# Altium footprint library connectors_micromatch.PcbLib: 36 footprints (part 2 of 3)
Each footprint in its own frame and in the unit in brackets; x right, y up, seen from the top. Pads: shape width x height; smd on the part's side, far side on the other; paste and mask are expansions set on the pad; w line width, h text height; cw(c..) or ccw(c..) is an arc to the next point about the centre after c.
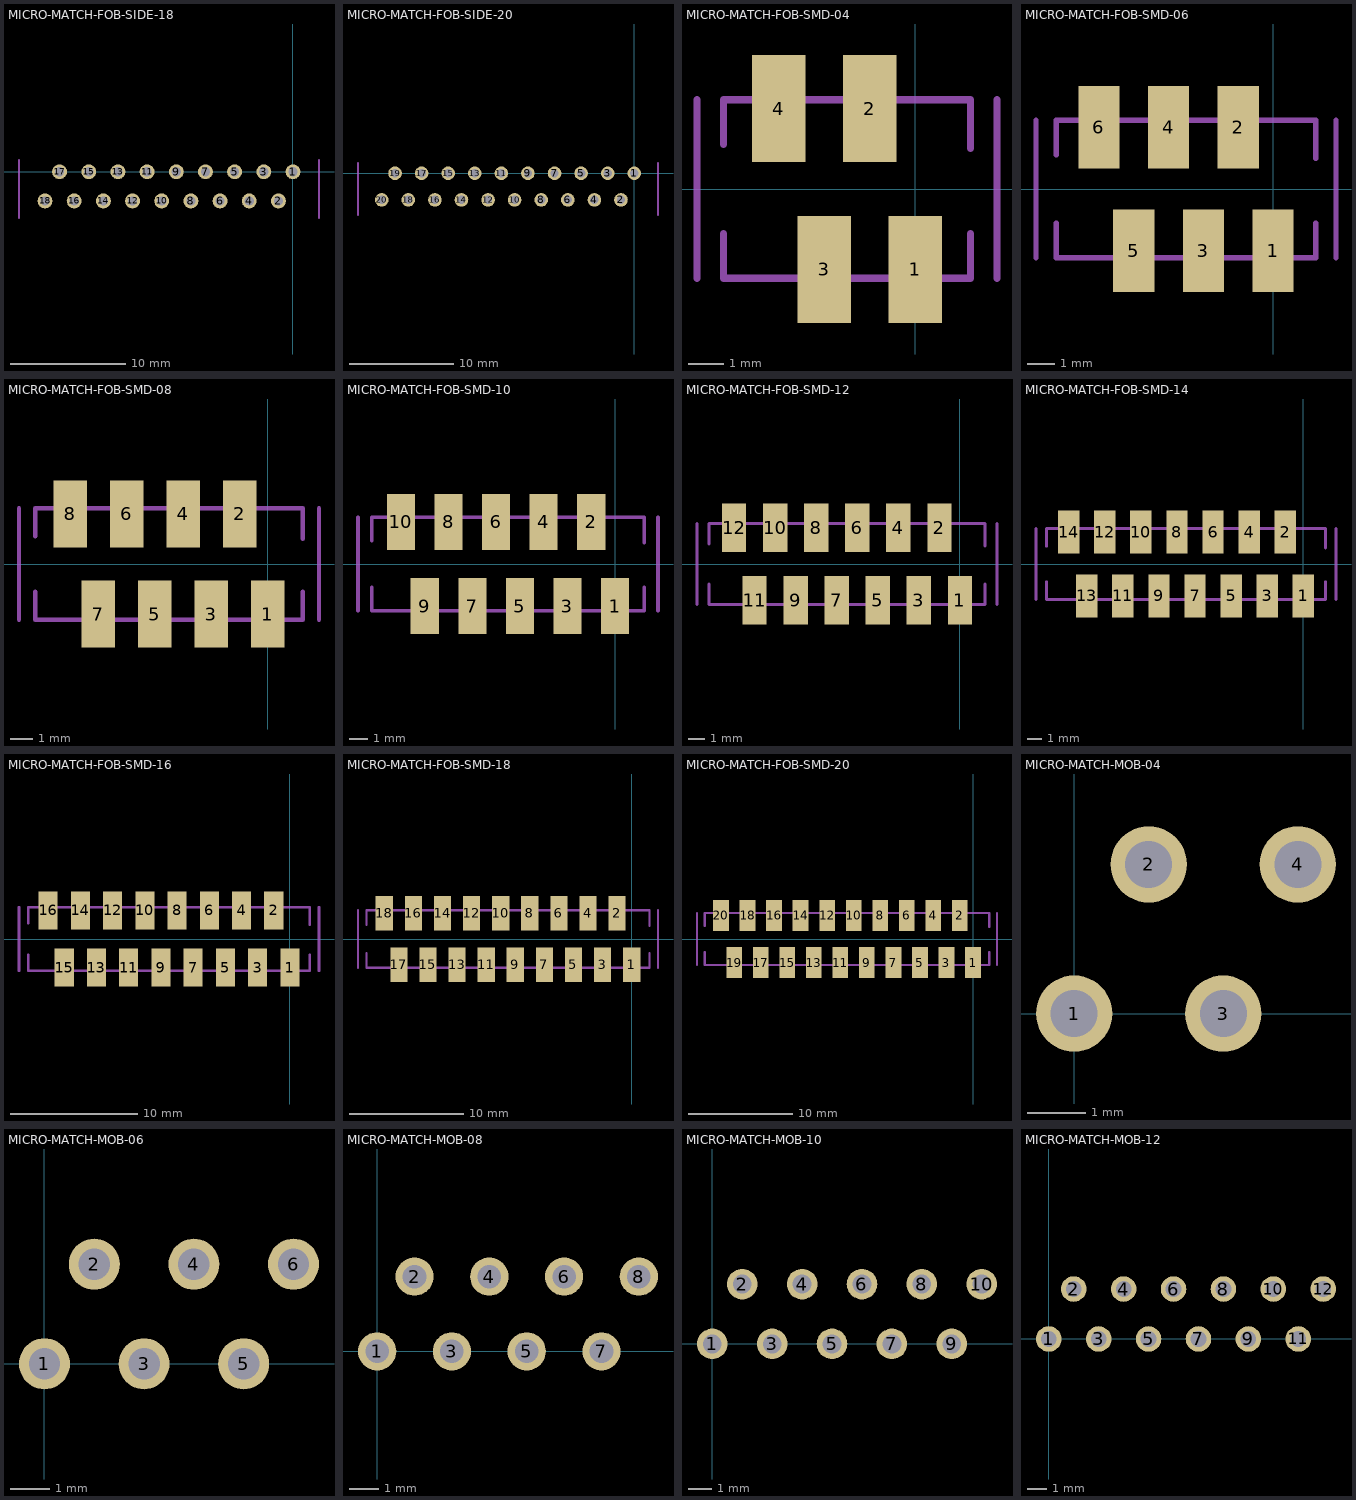
[diagram p1: the footprints below, top view; thin cyan lines are the x and y axes]

## MICRO-MATCH-FOB-SIDE-18 [mm]
height 4
pads (18):
  round 1.3 hole 0.8: 1(0,0) 2(-1.27,-2.54) 3(-2.54,0) 4(-3.81,-2.54) 5(-5.08,0) 6(-6.35,-2.54) 7(-7.62,0) 8(-8.89,-2.54) 9(-10.16,0) 10(-11.43,-2.54) 11(-12.7,0) 12(-13.97,-2.54) 13(-15.24,0) 14(-16.51,-2.54) 15(-17.78,0) 16(-19.05,-2.54) 17(-20.32,0) 18(-21.59,-2.54)
Mechanical 13:
  lines w0.2: -23.855,-4 -23.855,1 ; 2.265,-4 2.265,1
3D body "micromatch_fob_side_18.STEP": height 5.67, standoff -3.1, extent -23.19,-3.95 1.6,1.05

## MICRO-MATCH-FOB-SIDE-20 [mm]
height 4
pads (20):
  round 1.3 hole 0.8: 1(0,0) 2(-1.27,-2.54) 3(-2.54,0) 4(-3.81,-2.54) 5(-5.08,0) 6(-6.35,-2.54) 7(-7.62,0) 8(-8.89,-2.54) 9(-10.16,0) 10(-11.43,-2.54) 11(-12.7,0) 12(-13.97,-2.54) 13(-15.24,0) 14(-16.51,-2.54) 15(-17.78,0) 16(-19.05,-2.54) 17(-20.32,0) 18(-21.59,-2.54) 19(-22.86,0) 20(-24.13,-2.54)
Mechanical 13:
  lines w0.2: -26.395,-4 -26.395,1 ; 2.265,-4 2.265,1
3D body "micromatch_fob_side_20.STEP": height 5.67, standoff -3.1, extent -25.73,-3.95 1.6,1.05

## MICRO-MATCH-FOB-SMD-04 [mm]
height 4
pads (4):
  rect 1.5x3 smd: 1(0,-2.25) 2(-1.27,2.25) 3(-2.54,-2.25) 4(-3.81,2.25)
Mechanical 13:
  lines w0.2: -6.105,-2.5 -6.105,2.5 ; -5.365,-1.25 -5.365,-2.5 1.555,-2.5 1.555,-1.25 ; -5.365,1.25 -5.365,2.5 1.555,2.5 1.555,1.13 ; 2.295,-2.5 2.295,2.5
3D body "micromatch_fob_smd_04.STEP": height 5.25, standoff 0, extent -5.41,-3.45 1.6,3.45

## MICRO-MATCH-FOB-SMD-06 [mm]
height 4
pads (6):
  rect 1.5x3 smd: 1(0,-2.25) 2(-1.27,2.25) 3(-2.54,-2.25) 4(-3.81,2.25) 5(-5.08,-2.25) 6(-6.35,2.25)
Mechanical 13:
  lines w0.2: -8.645,-2.5 -8.645,2.5 ; -7.905,-1.25 -7.905,-2.5 1.555,-2.5 1.555,-1.25 ; -7.905,1.25 -7.905,2.5 1.555,2.5 1.555,1.13 ; 2.295,-2.5 2.295,2.5
3D body "micromatch_fob_smd_06.STEP": height 5.25, standoff 0, extent -7.95,-3.45 1.6,3.45

## MICRO-MATCH-FOB-SMD-08 [mm]
height 4
pads (8):
  rect 1.5x3 smd: 1(0,-2.25) 2(-1.27,2.25) 3(-2.54,-2.25) 4(-3.81,2.25) 5(-5.08,-2.25) 6(-6.35,2.25) 7(-7.62,-2.25) 8(-8.89,2.25)
Mechanical 13:
  lines w0.2: -11.185,-2.5 -11.185,2.5 ; -10.445,-1.25 -10.445,-2.5 1.555,-2.5 1.555,-1.25 ; -10.445,1.25 -10.445,2.5 1.555,2.5 1.555,1.13 ; 2.295,-2.5 2.295,2.5
3D body "micromatch_fob_smd_08.STEP": height 5.25, standoff 0, extent -10.49,-3.45 1.6,3.45

## MICRO-MATCH-FOB-SMD-10 [mm]
height 4
pads (10):
  rect 1.5x3 smd: 1(0,-2.25) 2(-1.27,2.25) 3(-2.54,-2.25) 4(-3.81,2.25) 5(-5.08,-2.25) 6(-6.35,2.25) 7(-7.62,-2.25) 8(-8.89,2.25) 9(-10.16,-2.25) 10(-11.43,2.25)
Mechanical 13:
  lines w0.2: -13.725,-2.5 -13.725,2.5 ; -12.985,-1.25 -12.985,-2.5 1.555,-2.5 1.555,-1.25 ; -12.985,1.25 -12.985,2.5 1.555,2.5 1.555,1.13 ; 2.295,-2.5 2.295,2.5
3D body "micromatch_fob_smd_10.STEP": height 5.25, standoff 0, extent -13.03,-3.45 1.6,3.45

## MICRO-MATCH-FOB-SMD-12 [mm]
height 4
pads (12):
  rect 1.5x3 smd: 1(0,-2.25) 2(-1.27,2.25) 3(-2.54,-2.25) 4(-3.81,2.25) 5(-5.08,-2.25) 6(-6.35,2.25) 7(-7.62,-2.25) 8(-8.89,2.25) 9(-10.16,-2.25) 10(-11.43,2.25) 11(-12.7,-2.25) 12(-13.97,2.25)
Mechanical 13:
  lines w0.2: -16.265,-2.5 -16.265,2.5 ; -15.525,-1.25 -15.525,-2.5 1.555,-2.5 1.555,-1.25 ; -15.525,1.25 -15.525,2.5 1.555,2.5 1.555,1.13 ; 2.295,-2.5 2.295,2.5
3D body "micromatch_fob_smd_12.STEP": height 5.25, standoff 0, extent -15.57,-3.45 1.6,3.45

## MICRO-MATCH-FOB-SMD-14 [mm]
height 4
pads (14):
  rect 1.5x3 smd: 1(0,-2.25) 2(-1.27,2.25) 3(-2.54,-2.25) 4(-3.81,2.25) 5(-5.08,-2.25) 6(-6.35,2.25) 7(-7.62,-2.25) 8(-8.89,2.25) 9(-10.16,-2.25) 10(-11.43,2.25) 11(-12.7,-2.25) 12(-13.97,2.25) 13(-15.24,-2.25) 14(-16.51,2.25)
Mechanical 13:
  lines w0.2: -18.805,-2.5 -18.805,2.5 ; -18.065,-1.25 -18.065,-2.5 1.555,-2.5 1.555,-1.25 ; -18.065,1.25 -18.065,2.5 1.555,2.5 1.555,1.13 ; 2.295,-2.5 2.295,2.5
3D body "micromatch_fob_smd_14.STEP": height 5.25, standoff 0, extent -18.11,-3.45 1.6,3.45

## MICRO-MATCH-FOB-SMD-16 [mm]
height 4
pads (16):
  rect 1.5x3 smd: 1(0,-2.25) 2(-1.27,2.25) 3(-2.54,-2.25) 4(-3.81,2.25) 5(-5.08,-2.25) 6(-6.35,2.25) 7(-7.62,-2.25) 8(-8.89,2.25) 9(-10.16,-2.25) 10(-11.43,2.25) 11(-12.7,-2.25) 12(-13.97,2.25) 13(-15.24,-2.25) 14(-16.51,2.25) 15(-17.78,-2.25) 16(-19.05,2.25)
Mechanical 13:
  lines w0.2: -21.345,-2.5 -21.345,2.5 ; -20.605,-1.25 -20.605,-2.5 1.555,-2.5 1.555,-1.25 ; -20.605,1.25 -20.605,2.5 1.555,2.5 1.555,1.13 ; 2.295,-2.5 2.295,2.5
3D body "micromatch_fob_smd_16.STEP": height 5.25, standoff 0, extent -20.65,-3.45 1.6,3.45

## MICRO-MATCH-FOB-SMD-18 [mm]
height 4
pads (18):
  rect 1.5x3 smd: 1(0,-2.25) 2(-1.27,2.25) 3(-2.54,-2.25) 4(-3.81,2.25) 5(-5.08,-2.25) 6(-6.35,2.25) 7(-7.62,-2.25) 8(-8.89,2.25) 9(-10.16,-2.25) 10(-11.43,2.25) 11(-12.7,-2.25) 12(-13.97,2.25) 13(-15.24,-2.25) 14(-16.51,2.25) 15(-17.78,-2.25) 16(-19.05,2.25) 17(-20.32,-2.25) 18(-21.59,2.25)
Mechanical 13:
  lines w0.2: -23.885,-2.5 -23.885,2.5 ; -23.145,-1.25 -23.145,-2.5 1.555,-2.5 1.555,-1.25 ; -23.145,1.25 -23.145,2.5 1.555,2.5 1.555,1.13 ; 2.295,-2.5 2.295,2.5
3D body "micromatch_fob_smd_18.STEP": height 5.25, standoff 0, extent -23.19,-3.45 1.6,3.45

## MICRO-MATCH-FOB-SMD-20 [mm]
height 4
pads (20):
  rect 1.5x3 smd: 1(0,-2.25) 2(-1.27,2.25) 3(-2.54,-2.25) 4(-3.81,2.25) 5(-5.08,-2.25) 6(-6.35,2.25) 7(-7.62,-2.25) 8(-8.89,2.25) 9(-10.16,-2.25) 10(-11.43,2.25) 11(-12.7,-2.25) 12(-13.97,2.25) 13(-15.24,-2.25) 14(-16.51,2.25) 15(-17.78,-2.25) 16(-19.05,2.25) 17(-20.32,-2.25) 18(-21.59,2.25) 19(-22.86,-2.25) 20(-24.13,2.25)
Mechanical 13:
  lines w0.2: -26.425,-2.5 -26.425,2.5 ; -25.685,-1.25 -25.685,-2.5 1.555,-2.5 1.555,-1.25 ; -25.685,1.25 -25.685,2.5 1.555,2.5 1.555,1.13 ; 2.295,-2.5 2.295,2.5
3D body "micromatch_fob_smd_20.STEP": height 5.25, standoff 0, extent -25.73,-3.45 1.6,3.45

## MICRO-MATCH-MOB-04 [mm]
height 4
pads (4):
  round 1.3 hole 0.8: 1(0,0) 2(1.27,2.54) 3(2.54,0) 4(3.81,2.54)
3D body "micromatch_mob_4.STEP": height 6.9, standoff -3.1, extent -2.225,-1.228 6.035,3.772

## MICRO-MATCH-MOB-06 [mm]
height 4
pads (6):
  round 1.3 hole 0.8: 1(0,0) 2(1.27,2.54) 3(2.54,0) 4(3.81,2.54) 5(5.08,0) 6(6.35,2.54)
3D body "micromatch_mob_6.STEP": height 6.9, standoff -3.1, extent -2.225,-1.228 8.575,3.772

## MICRO-MATCH-MOB-08 [mm]
height 4
pads (8):
  round 1.3 hole 0.8: 1(0,0) 2(1.27,2.54) 3(2.54,0) 4(3.81,2.54) 5(5.08,0) 6(6.35,2.54) 7(7.62,0) 8(8.89,2.54)
3D body "micromatch_mob_8.STEP": height 6.9, standoff -3.1, extent -2.225,-1.228 11.115,3.772

## MICRO-MATCH-MOB-10 [mm]
height 4
pads (10):
  round 1.3 hole 0.8: 1(0,0) 2(1.27,2.54) 3(2.54,0) 4(3.81,2.54) 5(5.08,0) 6(6.35,2.54) 7(7.62,0) 8(8.89,2.54) 9(10.16,0) 10(11.43,2.54)
3D body "micromatch_mob_10.STEP": height 6.9, standoff -3.1, extent -2.225,-1.228 13.655,3.772

## MICRO-MATCH-MOB-12 [mm]
height 4
pads (12):
  round 1.3 hole 0.8: 1(0,0) 2(1.27,2.54) 3(2.54,0) 4(3.81,2.54) 5(5.08,0) 6(6.35,2.54) 7(7.62,0) 8(8.89,2.54) 9(10.16,0) 10(11.43,2.54) 11(12.7,0) 12(13.97,2.54)
3D body "micromatch_mob_12.STEP": height 6.9, standoff -3.1, extent -2.225,-1.228 16.195,3.772